# Altium footprint library 电阻封装库.PcbLib: 218 footprints (part 8 of 14)
Each footprint in its own frame and in the unit in brackets; x right, y up, seen from the top. Pads: shape width x height; smd on the part's side, far side on the other; paste and mask are expansions set on the pad; w line width, h text height; cw(c..) or ccw(c..) is an arc to the next point about the centre after c.
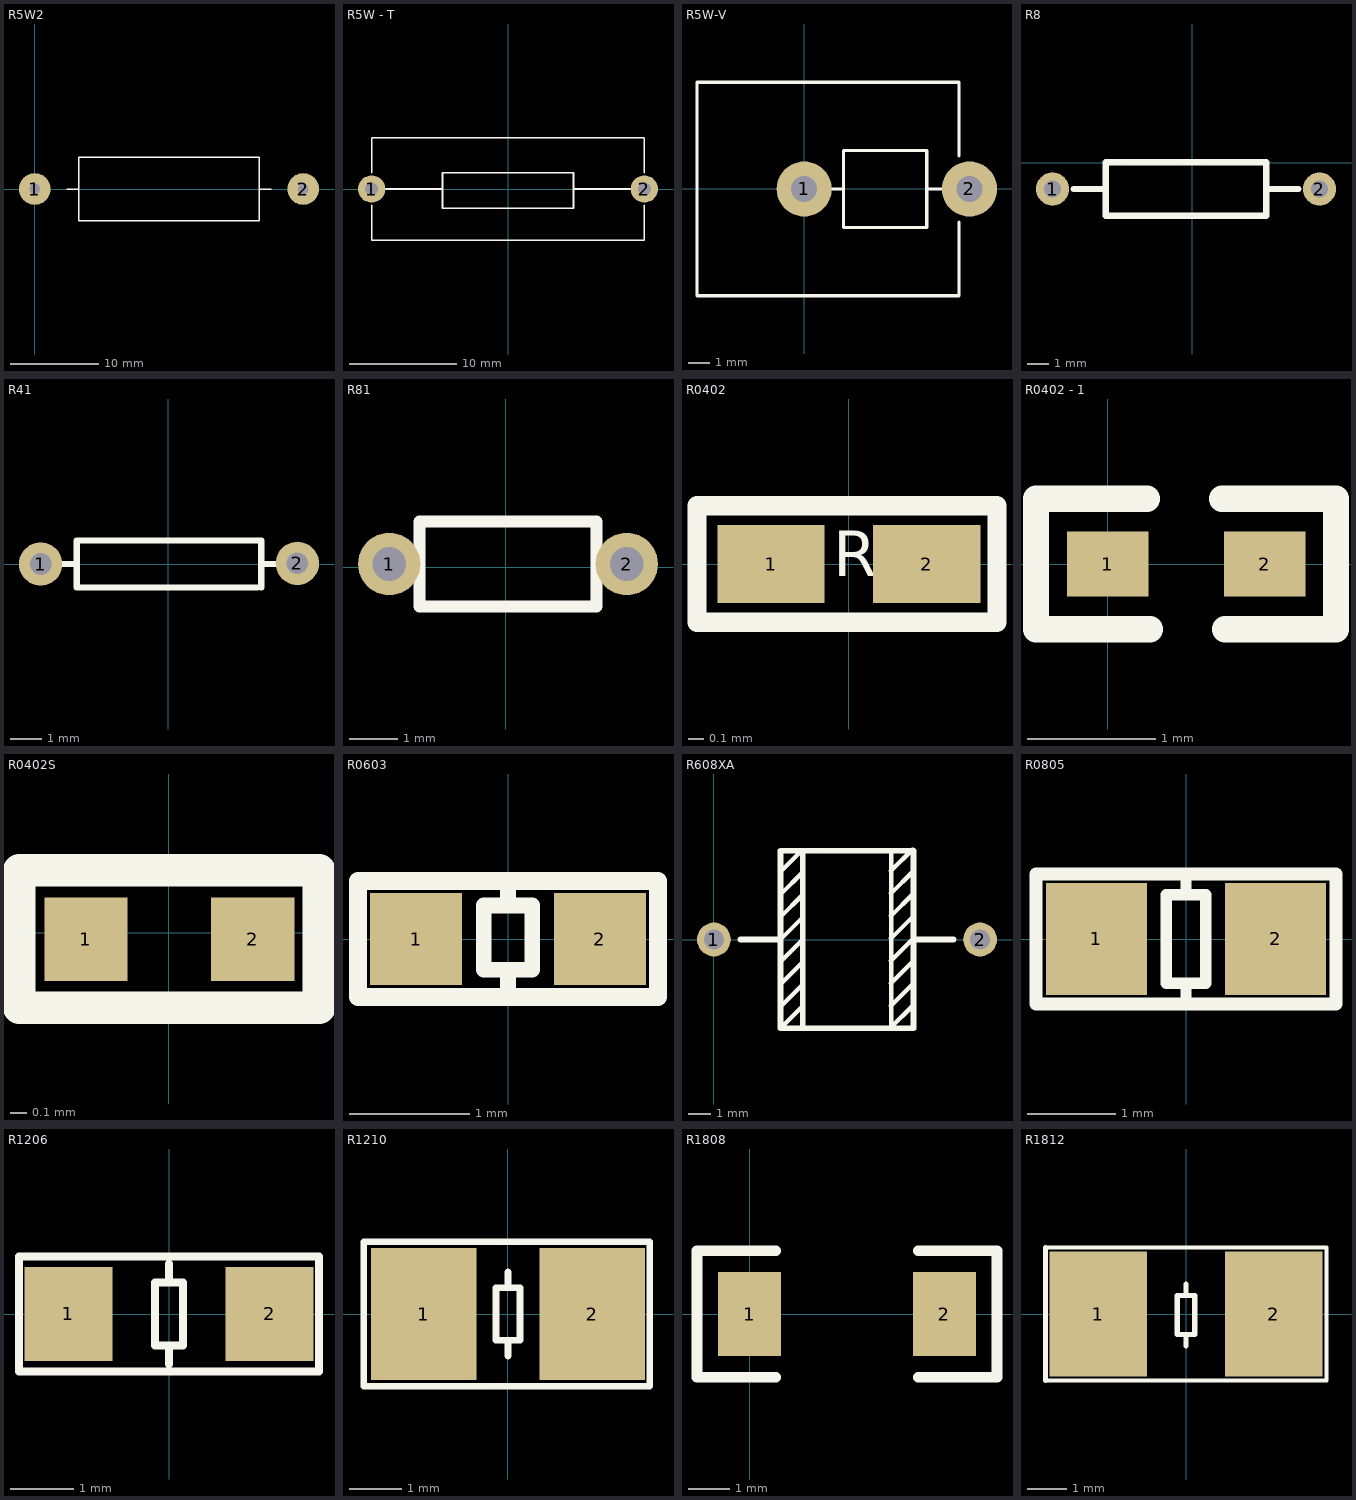
[diagram p7: the footprints below, top view; thin cyan lines are the x and y axes]

## R5W2 [mm]
pads (2):
  round 3.6 hole 1.2: 1(0,0) 2(30.48,0)
Top Overlay:
  lines w0.15: 3.6,0 4.975,0 ; 26.88,0 25.505,0 ; 4.975,0 4.975,3.6 25.505,3.6 25.505,0 ; 4.975,0 4.975,-3.6 25.505,-3.6 25.505,0
3D body "User Library-5w wid.step": height 7.85, standoff -3.35, extent -0.4,-3.5 30.88,3.5

## R5W - T [mm]
pads (2):
  round 2.54 hole 1.2: 1(-12.7,0) 2(12.7,0)
Top Overlay:
  lines w0.15: -12.7,-1.524 -12.7,-4.776 12.7,-4.776 12.7,-1.524 ; -12.7,1.524 -12.7,4.776 12.7,4.776 12.7,1.524 ; -11.684,0 -6.096,0 ; 6.096,0 11.684,0 ; -6.096,-1.778 -6.096,1.524 0,1.524 6.096,1.524 6.096,-1.778 -6.096,-1.778
3D body "User Library-5W Resistor.step": height 9.21, standoff -2.5, extent -13.2,-4.85 13.2,4.85

## R5W-V [mm]
pads (2):
  round 2.54 hole 1.2: 1(0,0) 2(7.62,0)
Top Overlay:
  lines w0.15: -4.941,1.524 -4.941,4.919 7.142,4.919 7.142,1.524 ; -4.941,1.566 -4.941,-4.919 7.142,-4.919 7.142,-1.524 ; 1.016,0 1.816,0 ; 5.648,0 6.794,0 ; 1.816,-1.778 5.648,-1.778 5.648,1.778 1.816,1.778 1.816,-1.778
3D body "User Library-5W Res.step": height 23.05, standoff -2.4, extent -5.016,-5 8.064,5

## R8 [mil]
pads (2):
  round 62 hole 32: 1(-261.57,-49.29) 2(238.43,-49.29)
Top Overlay:
  lines w12: -221.57,-49.29 -161.57,-49.29 ; 138.43,-49.29 198.43,-49.29 ; -161.57,-99.29 138.43,-99.29 138.43,0.71 -161.57,0.71 -161.57,-99.29

## R41 [mm]
pads (2):
  round 1.4 hole 0.7: 1(-4.12,0) 2(4.18,0.02)
Top Overlay:
  lines w0.203: -3.462,0 -2.954,0 ; 2.888,-0.762 -2.954,-0.762 -2.954,0.762 3.015,0.762 3.015,-0.762 ; 3.015,0 3.523,0

## R81 [mm]
pads (2):
  round 1.3 hole 0.7: 1(-2.432,0.072) 2(2.521,0.072)
Top Overlay:
  lines w0.254: -1.797,-0.817 -1.797,0.961 1.886,0.961 1.886,-0.817 -1.797,-0.817

## R0402 [mil]
pads (2):
  rect 27.56x20 smd: 1(-20,0) 2(20,0)
Top Overlay:
  lines w5: -39,-15 -39,15 38,15 38,-15 -39,-15
  text "R" at -4,-7 h20
3D body "0402_R.step": height 15.09, standoff 0.79, extent -19.39,-9.85 19.61,10.15

## R0402 - 1 [mil] "1/16W"
pads (2):
  rect 25x20 smd: 1(0,0) 2(48.2,0)
Top Overlay:
  lines w8: 12,20 -22,20 -22,-20 13,-20 ; 35,20 70,20 70,-20 36,-20
3D body "R0402.STEP": height 13.78, standoff 0, extent 4.71,-9.79 44.09,9.9

## R0402S [mil] "1/16W"
pads (2):
  rect 20x20 smd: 1(-19.93,-1.58) 2(20.07,-1.58)
Top Overlay:
  lines w7.87: -36,-18 36,-18 36,15 -36,15 -36,-18
3D body "R0402.STEP": height 13.78, standoff 0, extent -19.59,-11.6 19.79,8.09

## R0603 [mil]
pads (2):
  rect 30x30 smd: 1(-30,0) 2(30,0)
Top Overlay:
  lines w5.12: 0,-19 0,-10.06 ; 0,10.94 0,19 ; -7.87,-10.06 -7.87,10.94 7.87,10.94 7.87,-10.06 -7.87,-10.06
  lines w5.91: -49,-19 -49,19 49,19 49,-19 -49,-19
3D body "R0603.STEP": height 17.72, standoff 0, extent -31.49,-15.74 31.5,15.75

## R608XA [mil]
pads (2):
  round 60 hole 35: 1(0,0) 2(472.44,0)
Top Overlay:
  lines w8: 118.11,-157.48 155.59,-120 ; 118.11,-119.37 157.48,-80 ; 118.11,-79.37 157.48,-40 ; 118.11,-39.37 157.48,0 ; 118.11,0 158.11,40 ; 118.11,40 157.48,79.37 ; 118.11,80 157.48,119.37 ; 118.11,120 155.59,157.48 157.48,157.48 ; 314.31,-155.69 351.79,-118.21 ; 314.31,-117.58 353.68,-78.21 ; 314.31,-77.58 353.68,-38.21 ; 314.31,-37.58 353.68,1.79 ; 314.31,1.79 354.31,41.79 ; 314.31,41.79 353.68,81.16 ; 314.31,81.79 353.68,121.16 ; 314.31,121.79 351.79,159.27 353.68,159.27 ; 314.96,-157.48 314.96,157.48
  lines w10: 47.24,0 118.11,0 ; 157.48,-157.48 157.48,157.48 ; 354.33,0 425.2,0 ; 118.11,-157.48 118.11,157.48 354.33,157.48 354.33,-157.48 118.11,-157.48

## R0805 [mil]
pads (2):
  rect 45x50 smd: 1(-40,0) 2(40,0)
Top Overlay:
  lines w5.12: 0,-29 0,-19.68 ; 0,19.69 0,26 ; -8.86,-19.68 8.86,-19.68 8.86,19.69 -8.86,19.69 -8.86,-19.68
  lines w5.91: -67,-29 67,-29 67,29 -67,29 -67,-29
3D body "R0805.STEP": height 21.65, standoff 0, extent -38.37,-24.8 40.37,24.81

## R1206 [mm]
pads (2):
  rect 1.4x1.5 smd: 1(-1.6,0) 2(1.6,0)
Top Overlay:
  lines w0.127: -2.388,-0.914 -2.388,0.914 2.388,0.914 2.388,-0.914 -2.388,-0.914
  lines w0.13: 0,-0.8 0,-0.5 ; 0,0.5 0,0.8 ; -0.225,-0.5 0.225,-0.5 0.225,0.5 -0.225,0.5 -0.225,-0.5
3D body "R1206.STEP": height 0.6, standoff 0, extent -1.625,-0.8 1.575,0.8

## R1210 [mm]
pads (2):
  rect 2x2.5 smd: 1(-1.6,0) 2(1.6,0)
Top Overlay:
  lines w0.127: -2.743,-1.372 2.692,-1.372 2.692,1.372 -2.743,1.372 -2.743,-1.372
  lines w0.13: 0,-0.8 0,-0.5 ; 0,0.5 0,0.8 ; -0.225,-0.5 0.225,-0.5 0.225,0.5 -0.225,0.5 -0.225,-0.5
3D body "1210_R.step": height 0.63, standoff 0.02, extent -1.562,-1.298 1.639,1.293

## R1808 [mil]
pads (2):
  rect 60x80 smd: 1(0,0) 2(185,0)
Top Overlay:
  lines w10: 25,-60 -50,-60 -50,60 25,60 ; 160,-60 235,-60 235,60 160,60
3D body "R1808(4520M)1.STEP": height 39.37, standoff 0, extent 2,-39 179.77,37.49

## R1812 [mm]
pads (2):
  rect 2.5x3.2 smd: 1(-2.25,0) 2(2.25,0)
Top Overlay:
  lines w0.1: -3.607,-1.702 3.607,-1.702 3.607,1.702 -3.607,1.702
  lines w0.127: -3.607,-1.702 -3.607,1.702
  lines w0.13: 0,-0.825 0,-0.525 ; 0,0.475 0,0.775 ; -0.225,-0.525 0.225,-0.525 0.225,0.475 -0.225,0.475 -0.225,-0.525
3D body "1812_R.step": height 0.61, standoff 0, extent -2.259,-1.6 2.341,1.6